# Altium footprint library Terra.PcbLib: 59 footprints (part 4 of 4)
Each footprint in its own frame and in the unit in brackets; x right, y up, seen from the top. Pads: shape width x height; smd on the part's side, far side on the other; paste and mask are expansions set on the pad; w line width, h text height; cw(c..) or ccw(c..) is an arc to the next point about the centre after c.
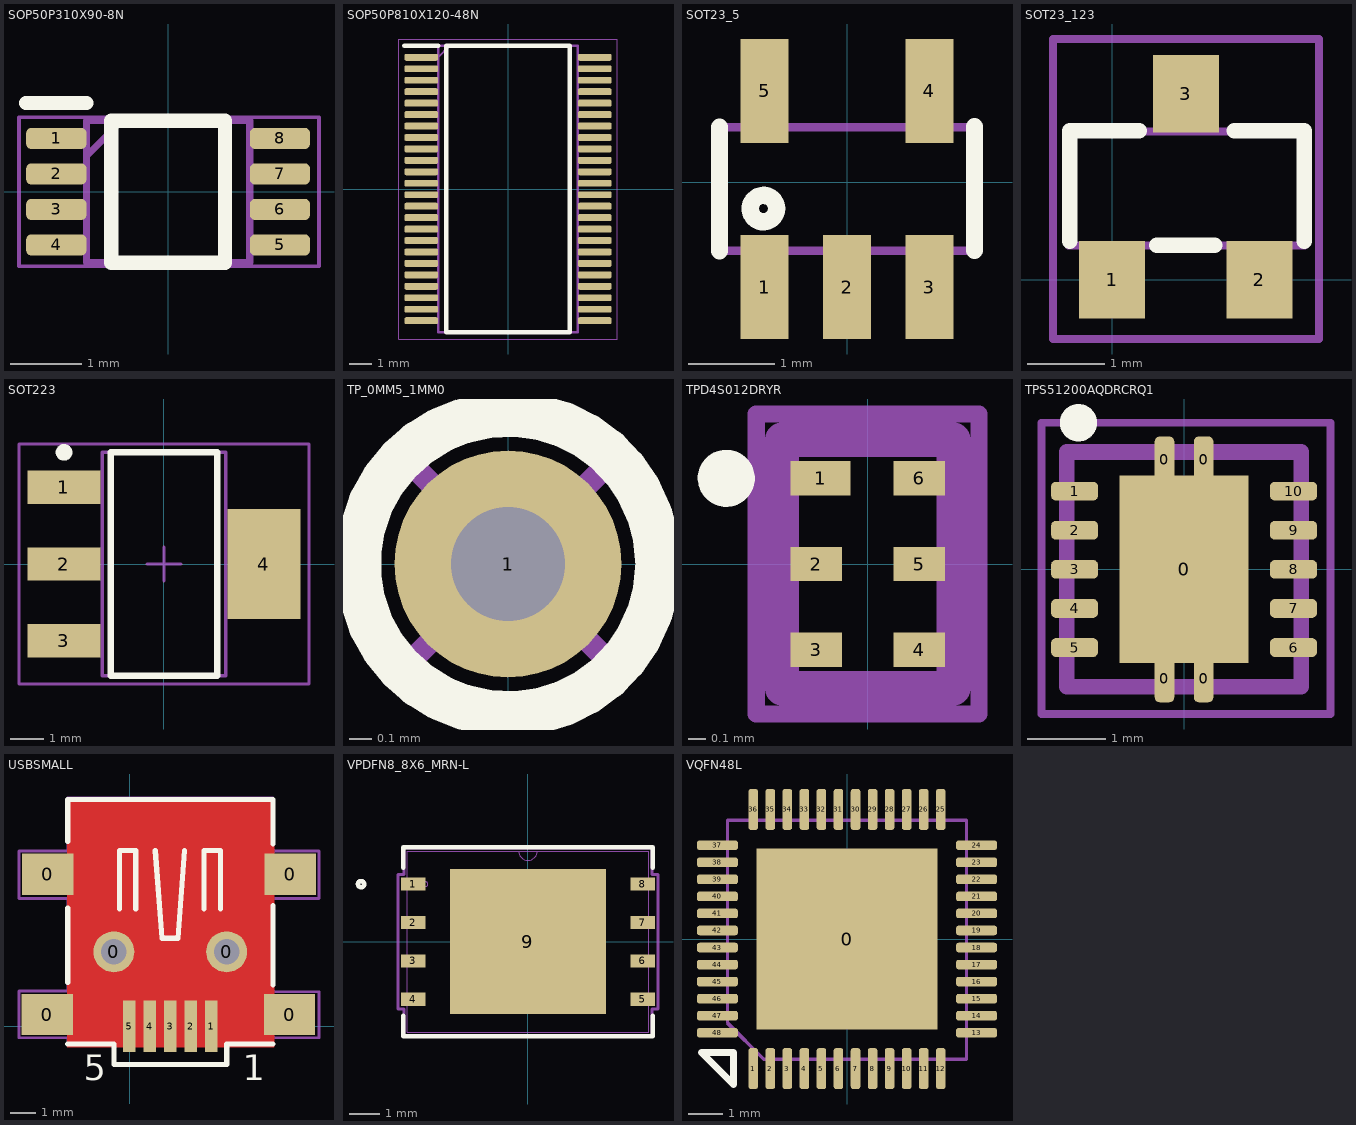
[diagram p3: the footprints below, top view; thin cyan lines are the x and y axes]

## SOP50P310X90-8N [mm]
pads (8):
  rrect50% 0.85x0.3 smd: 1(-1.575,0.75) 2(-1.575,0.25) 3(-1.575,-0.25) 4(-1.575,-0.75) 5(1.575,-0.75) 6(1.575,-0.25) 7(1.575,0.25) 8(1.575,0.75)
Top Overlay:
  lines w0.2: -2,1.25 -1.15,1.25 ; -0.8,-1 -0.8,1 0.8,1 0.8,-1 -0.8,-1
Mechanical 1:
  lines w0.1: -1.15,0.5 -0.65,1 ; -1.15,-1 -1.15,1 1.15,1 1.15,-1 -1.15,-1
  text ".Designator" at -1.075,-0.2 h0.6
Mechanical 15:
  lines w0.05: -2.1,-1.05 -2.1,1.05 2.125,1.05 2.125,-1.05 -2.1,-1.05
3D body "SN74LXC2T45DCUR.stp": height 0.77, standoff 0, extent -1.55,-1 1.55,1

## SOP50P810X120-48N [mm]
pads (48):
  rrect50% 1.475x0.3 smd: 1(-3.788,5.75) 2(-3.788,5.25) 3(-3.788,4.75) 4(-3.788,4.25) 5(-3.788,3.75) 6(-3.788,3.25) 7(-3.788,2.75) 8(-3.788,2.25) 9(-3.788,1.75) 10(-3.788,1.25) 11(-3.788,0.75) 12(-3.788,0.25) 13(-3.788,-0.25) 14(-3.788,-0.75) 15(-3.788,-1.25) 16(-3.788,-1.75) 17(-3.788,-2.25) 18(-3.788,-2.75) 19(-3.788,-3.25) 20(-3.788,-3.75) 21(-3.788,-4.25) 22(-3.788,-4.75) 23(-3.788,-5.25) 24(-3.788,-5.75) 25(3.788,-5.75) 26(3.788,-5.25) 27(3.788,-4.75) 28(3.788,-4.25) 29(3.788,-3.75) 30(3.788,-3.25) 31(3.788,-2.75) 32(3.788,-2.25) 33(3.788,-1.75) 34(3.788,-1.25) 35(3.788,-0.75) 36(3.788,-0.25) 37(3.788,0.25) 38(3.788,0.75) 39(3.788,1.25) 40(3.788,1.75) 41(3.788,2.25) 42(3.788,2.75) 43(3.788,3.25) 44(3.788,3.75) 45(3.788,4.25) 46(3.788,4.75) 47(3.788,5.25) 48(3.788,5.75)
Top Overlay:
  lines w0.2: -4.525,6.25 -3.05,6.25 ; -2.7,-6.25 2.7,-6.25 2.7,6.25 -2.7,6.25 -2.7,-6.25
Mechanical 1:
  text ".Designator" at 0.182,-3.716 h0.8
Mechanical 13:
  lines w0.1: -3.05,5.75 -2.55,6.25 ; -3.05,-6.25 3.05,-6.25 3.05,6.25 -3.05,6.25 -3.05,-6.25
Mechanical 15:
  lines w0.05: -4.775,-6.55 4.775,-6.55 4.775,6.55 -4.775,6.55 -4.775,-6.55
3D body "SN74LVCH16T245DGGR.stp": height 1.1, standoff 0, extent -4.06,-6.25 4.061,6.25

## SOT23_5 [mil]
pads (5):
  rect 22x47.24 smd mask+3.94: 1(-37.5,-47.68) 2(0,-47.68) 3(37.5,-47.68) 4(37.5,41.46) 5(-37.5,41.46)
Top Overlay:
  circle w7.87: c-38,-12 r6
  lines w7.87: -58,-31.25 -58,25 ; 58,-31 58,25.25
Mechanical 1:
  lines w3.94: -58,-31.25 -58,25 ; -56.25,-31.25 58,-31.25 58,25 -56.25,25
  text ".Designator" at -41,-18 h31.5
3D body "User Library-sot235.STEP": height 39.37, standoff 0, extent -57.09,-50.01 57.87,42.12

## SOT23_123 [mm] "SOT-23; 3 Leads; Body 3.1 x 2.5 mm, inc. leads (LxW max)"
height 1.09
pads (3):
  rect 0.85x1 smd: 1(0,0) 2(1.9,0) 3(0.95,2.4)
Top Overlay:
  lines w0.2: -0.55,0.5 -0.55,1.925 0.35,1.925 ; 0.575,0.45 1.325,0.45 ; 1.575,1.925 2.475,1.925 2.475,0.5
Mechanical 1:
  lines w0.1: -0.563,0.443 -0.563,1.916 2.485,1.916 2.485,0.443 -0.563,0.443
  text ".Designator" at -0.055,0.773 h0.8
Mechanical 15:
  lines w0.1: -0.762,-0.762 -0.762,3.108 2.667,3.108 2.667,-0.762 -0.762,-0.762
3D body "SW3dPS-3-lead sot23-3.STEP": height 1.01, standoff -0.01, extent -0.525,-0.063 2.395,2.413

## SOT223 [mm]
height 1.8
pads (4):
  rect 2.2x1 smd: 1(-3,2.3) 2(-3,0) 3(-3,-2.3)
  rect 2.2x3.3 smd: 4(3,0)
Top Overlay:
  circle w0.25: c-3,3.35 r0.125
  lines w0.2: -1.6,-3.35 -1.6,3.35 1.6,3.35 1.6,-3.35 -1.6,-3.35
Mechanical 1:
  lines w0.1: -1.85,-3.35 -1.85,3.35 1.85,3.35 1.85,-3.35 -1.85,-3.35
  text ".Designator" at -0.325,2.9 h1.5
Mechanical 15:
  lines w0.1: -0.5,0 0.5,0 ; 0,-0.5 0,0.5 ; -4.35,-3.6 -4.35,3.6 4.35,3.6 4.35,-3.6 -4.35,-3.6
3D body: height 1.8, standoff 0, extent -1.85,-3.35 1.85,3.35
3D body "SOT-223.STEP": height 1.7, standoff 0, extent -3.572,-3.249 3.319,3.251

## TP_0MM5_1MM0 [mm] "Тестовая точка с отверстием 0.5мм и площадкой 1мм"
pads (1):
  round 1 hole 0.5: 1(0,0)
Top Overlay:
  circle w0.2: c0,0 r0.66
  text ".MarkPCB" at -2.616,-1.778 h1
Bottom Overlay:
  text ".MarkPCB" at 3.937,-1.803 h1
Mechanical 1:
  circle w0.1: c0,0 r0.66
  lines w0.1: -0.455,-0.455 0.47,0.47 ; -0.455,0.47 0.47,-0.455
  text ".Designator" at -0.975,0.9 h0.6
Mechanical 2:
  circle w0.1: c0,0 r0.66
  lines w0.1: -0.455,-0.455 0.47,0.47 ; -0.455,0.47 0.47,-0.455
  text ".Designator" at 0.975,0.9 h0.6

## TPD4S012DRYR [mm]
pads (6):
  rect 0.35x0.2 smd: 1(-0.275,0.5)
  rect 0.3x0.2 smd: 2(-0.3,0) 3(-0.3,-0.5) 4(0.3,-0.5) 5(0.3,0) 6(0.3,0.5)
Top Overlay:
  lines w0.2: -0.776,0.455 cw(c-0.825,0.5) -0.775,0.456
Mechanical 13:
  lines w0.2: -0.5,-0.725 0.5,-0.725 0.5,0.725 -0.5,0.725 -0.5,-0.725
Mechanical 15:
  lines w0.1: -0.65,-0.875 0.65,-0.875 0.65,0.875 -0.65,0.875 -0.65,-0.875
3D body "TPD4S012DRYR.stp": height 0.58, standoff 0, extent -0.5,-0.725 0.5,0.725

## TPS51200AQDRCRQ1 [mm]
pads (15):
  rrect50% 0.25x0.6 smd: 0(-0.25,-1.4) 0(-0.25,1.4) 0(0.25,-1.4) 0(0.25,1.4)
  rect 1.65x2.4 smd: 0(0,0)
  rrect50% 0.6x0.24 smd: 1(-1.4,1) 2(-1.4,0.5) 3(-1.4,0) 4(-1.4,-0.5) 5(-1.4,-1) 6(1.4,-1) 7(1.4,-0.5) 8(1.4,0) 9(1.4,0.5) 10(1.4,1)
Top Overlay:
  circle w0.254: c-1.35,1.875 r0.112
Mechanical 13:
  lines w0.2: -1.5,-1.5 1.5,-1.5 1.5,1.5 -1.5,1.5 -1.5,-1.5
Mechanical 15:
  lines w0.1: -1.825,-1.85 1.875,-1.85 1.875,1.875 -1.825,1.875 -1.825,-1.85
3D body "TPS51200AQDRCRQ1.stp": height 1, standoff 0, extent -1.5,-1.5 1.5,1.5

## USBSMALL [mm]
height 0.025
pads (11):
  rect 2x1.6 smd mask+0.102: 0(-3.225,0.45) 0(-3.2,5.925) 0(6.225,0.45) 0(6.25,5.925)
  round 1.6 hole 1: 0(-0.625,2.9) 0(3.775,2.9)
  rect 0.499x2 smd: 1(3.175,0) 2(2.375,0) 3(1.575,0) 4(0.775,0) 5(-0.025,0)
Top Layer:
  region: 5.461,8.575 -2.286,8.575 -2.286,-0.635 -0.635,-0.635 -0.635,1.397 3.81,1.397 3.81,-0.635 5.461,-0.635
  pour cut-out: 5.625,8.875 -2.45,8.875 -2.45,-0.825 5.625,-0.825
Top Overlay:
  lines w0.2: -2.425,-0.7 -0.625,-0.7 -0.625,-1.5 3.775,-1.5 3.775,-0.7 5.575,-0.7 ; -2.425,1.7 -2.425,4.6 ; -2.425,7.2 -2.425,8.839 5.575,8.839 5.575,7.1 ; -0.406,4.572 -0.406,6.858 0.229,6.858 0.229,4.572 ; 0.991,6.858 1.245,3.429 1.88,3.429 2.134,6.858 ; 2.894,6.858 3.529,6.858 ; 2.896,4.572 2.896,6.858 ; 3.531,4.572 3.531,6.858 ; 5.575,1.6 5.575,4.7
  text ".Designator" at -1,-3.8 h1
  text "5" at -1.8,-2.1 h1
  text "1" at 4.4,-2.1 h1
Mechanical 1:
  lines w0.1: -4.325,-0.457 -2.425,-0.457 -2.425,-0.7 5.575,-0.7 5.575,-0.457 7.375,-0.457 7.375,1.346 5.575,1.346 5.575,4.978 7.375,4.978 7.375,6.833 5.575,6.833 5.575,8.9 -2.425,8.9 -2.425,6.833 -4.325,6.833 -4.325,4.978 -2.425,4.978 -2.425,1.372 -4.325,1.372 -4.325,-0.457
  text "1" at 3.9,-0.1 h1
  text "5" at -1.2,-0.1 h1
  text ".Designator" at -0.9,3.6 h1.5
3D body "SW3dPS-USB_mini_B.STEP": height 3.95, standoff -1, extent -3.763,-0.437 6.937,8.763

## VPDFN8_8X6_MRN-L [mil]
pads (9):
  rect 32x17 smd paste+0 mask+0: 1(-149.5,75) 2(-149.5,25) 3(-149.5,-25) 4(-149.5,-75) 5(149.5,-75) 6(149.5,-25) 7(149.5,25) 8(149.5,75)
  rect 203x189 smd paste+0 mask+0: 9(0,0)
Top Overlay:
  circle w6: c-217.5,75 r4
  lines w6: -162.5,-96.6 -162.5,-123 162.5,-123 162.5,-96.6 ; -162.5,96.6 -162.5,123 162.5,123 162.5,96.6
Top Paste:
  region: 97.56,-35.44 54.69,-35.44 54.69,-90.56 97.56,-90.56
  region: 97.56,27.56 54.69,27.56 54.69,-27.56 97.56,-27.56
  region: 97.56,90.56 54.69,90.56 54.69,35.44 97.56,35.44
  region: 46.81,-35.44 3.94,-35.44 3.94,-90.56 46.81,-90.56
  region: 46.81,27.56 3.94,27.56 3.94,-27.56 46.81,-27.56
  region: 46.81,90.56 3.94,90.56 3.94,35.44 46.81,35.44
  region: -3.94,-35.44 -46.81,-35.44 -46.81,-90.56 -3.94,-90.56
  region: -3.94,27.56 -46.81,27.56 -46.81,-27.56 -3.94,-27.56
  region: -3.94,90.56 -46.81,90.56 -46.81,35.44 -3.94,35.44
  region: -54.69,-35.44 -97.56,-35.44 -97.56,-90.56 -54.69,-90.56
  region: -54.69,27.56 -97.56,27.56 -97.56,-27.56 -54.69,-27.56
  region: -54.69,90.56 -97.56,90.56 -97.56,35.44 -54.69,35.44
Mechanical 13:
  circle w0: c-133.5,75 r3
  lines w0: -12,118 ccw(c0,118) 12,118
  lines w1: -157.5,-118 -157.5,118 157.5,118 157.5,-118 -157.5,-118
Mechanical 15:
  lines w3.94: -169.5,-87.5 -161.5,-87.5 -161.5,-122 161.5,-122 161.5,-87.5 169.5,-87.5 169.5,87.5 161.5,87.5 161.5,122 -161.5,122 -161.5,87.5 -169.5,87.5 -169.5,-87.5
3D body "VPDFN8_8X6_MRN.step": height 39.09, standoff 0, extent -157.52,-117.99 157.52,118

## VQFN48L [mm]
pads (49):
  rect 5.3x5.3 smd: 0(0,0)
  rrect50% 0.28x1.2 smd: 1(-2.75,-3.8) 2(-2.25,-3.8) 3(-1.75,-3.8) 4(-1.25,-3.8) 5(-0.75,-3.8) 6(-0.25,-3.8) 7(0.25,-3.8) 8(0.75,-3.8) 9(1.25,-3.8) 10(1.75,-3.8) 11(2.25,-3.8) 12(2.75,-3.8) 25(2.75,3.8) 26(2.25,3.8) 27(1.75,3.8) 28(1.25,3.8) 29(0.75,3.8) 30(0.25,3.8) 31(-0.25,3.8) 32(-0.75,3.8) 33(-1.25,3.8) 34(-1.75,3.8) 35(-2.25,3.8) 36(-2.75,3.8)
  rrect50% 1.2x0.28 smd: 13(3.8,-2.75) 14(3.8,-2.25) 15(3.8,-1.75) 16(3.8,-1.25) 17(3.8,-0.75) 18(3.8,-0.25) 19(3.8,0.25) 20(3.8,0.75) 21(3.8,1.25) 22(3.8,1.75) 23(3.8,2.25) 24(3.8,2.75) 37(-3.8,2.75) 38(-3.8,2.25) 39(-3.8,1.75) 40(-3.8,1.25) 41(-3.8,0.75) 42(-3.8,0.25) 43(-3.8,-0.25) 44(-3.8,-0.75) 45(-3.8,-1.25) 46(-3.8,-1.75) 47(-3.8,-2.25) 48(-3.8,-2.75)
Top Overlay:
  lines w0.2: -4.267,-3.327 -3.327,-3.327 -3.327,-4.267 -4.267,-3.327
Mechanical 1:
  lines w0.1: 3.495,3.48 -3.505,3.48 -3.505,-2.464 -2.438,-3.531 3.505,-3.531 ; 3.505,-3.52 3.505,3.48
  text ".Designator" at -1.321,-0.381 h1
3D body "SW3dPS-LQFP48.STEP": height 1.5, standoff 0, extent -4.5,-4.5 4.5,4.5